# Altium footprint library Reflow3D1411sep.PcbLib: 657 footprints (part 35 of 42)
Each footprint in its own frame and in the unit in brackets; x right, y up, seen from the top. Pads: shape width x height; smd on the part's side, far side on the other; paste and mask are expansions set on the pad; w line width, h text height; cw(c..) or ccw(c..) is an arc to the next point about the centre after c.
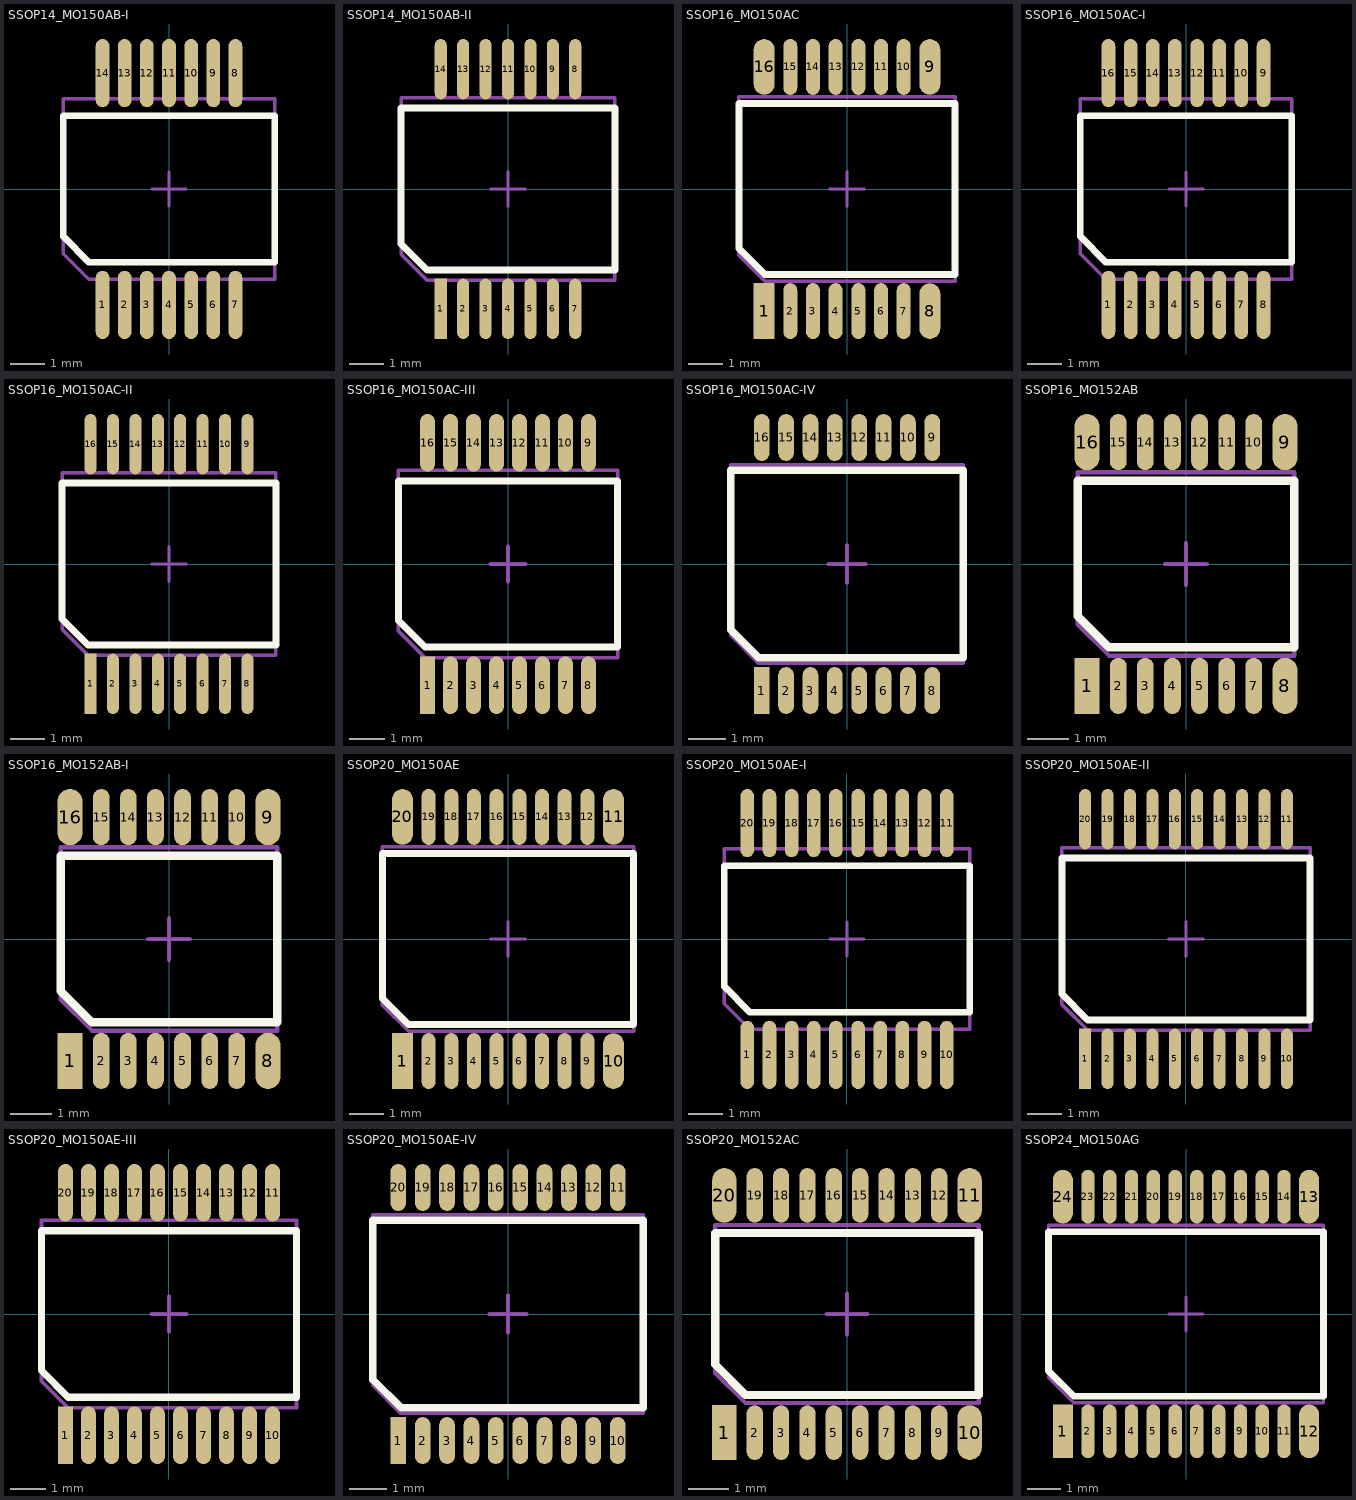
[diagram p34: the footprints below, top view; thin cyan lines are the x and y axes]

## SSOP14_MO150AB-I [mm] "www.ti.com, msso002e.pdf, DB14.asc; www.jedec.org, Mo-150b.pdf"
height 1.85
pads (14):
  oval 0.4x2 smd mask+0.05: 1(-1.95,-3.4) 2(-1.3,-3.4) 3(-0.65,-3.4) 4(0,-3.4) 5(0.65,-3.4) 6(1.3,-3.4) 7(1.95,-3.4) 8(1.95,3.4) 9(1.3,3.4) 10(0.65,3.4) 11(0,3.4) 12(-0.65,3.4) 13(-1.3,3.4) 14(-1.95,3.4)
Top Overlay:
  lines w0.2: -3.1,-1.4 -3.1,2.15 3.1,2.15 3.1,-2.15 -2.35,-2.15 -3.1,-1.4
Mechanical 13:
  lines w0.1: -3.1,-1.9 -3.1,2.65 3.1,2.65 3.1,-2.65 -2.35,-2.65 -3.1,-1.9
Mechanical 15:
  lines w0.1: -0.5,0 0.5,0 ; 0,-0.5 0,0.5
3D body: height 2, standoff 0, extent -3.25,-2.8 3.25,2.8

## SSOP14_MO150AB-II [mm] "www.idt.com, PSC4032.pdf"
height 1.86
pads (14):
  rect 0.35x1.75 smd mask+0.075: 1(-1.95,-3.475)
  oval 0.35x1.75 smd mask+0.075: 2(-1.3,-3.475) 3(-0.65,-3.475) 4(0,-3.475) 5(0.65,-3.475) 6(1.3,-3.475) 7(1.95,-3.475) 8(1.95,3.475) 9(1.3,3.475) 10(0.65,3.475) 11(0,3.475) 12(-0.65,3.475) 13(-1.3,3.475) 14(-1.95,3.475)
Top Overlay:
  lines w0.2: -3.1,-1.6 -3.1,2.35 3.1,2.35 3.1,-2.35 -2.35,-2.35 -3.1,-1.6
Mechanical 13:
  lines w0.1: -3.1,-1.9 -2.35,-2.65 3.1,-2.65 3.1,2.65 -3.1,2.65 -3.1,-1.9
Mechanical 15:
  lines w0.1: -0.5,0 0.5,0 ; 0,-0.5 0,0.5
3D body: height 1.99, standoff 0, extent -3.25,-2.69 3.25,2.69

## SSOP16_MO150AC [mm] "www.nxp.com, sot338-1.pdf, SOT338-1_fp_reflow.pdf"
height 1.85
pads (16):
  rect 0.6x1.6 smd mask+0.05: 1(-2.375,-3.5)
  oval 0.4x1.6 smd mask+0.05: 2(-1.625,-3.5) 3(-0.975,-3.5) 4(-0.325,-3.5) 5(0.325,-3.5) 6(0.975,-3.5) 7(1.625,-3.5) 10(1.625,3.5) 11(0.975,3.5) 12(0.325,3.5) 13(-0.325,3.5) 14(-0.975,3.5) 15(-1.625,3.5)
  oval 0.6x1.6 smd mask+0.05: 8(2.375,-3.5) 9(2.375,3.5) 16(-2.375,3.5)
Top Overlay:
  lines w0.2: -3.1,-1.7 -2.35,-2.45 3.1,-2.45 3.1,2.45 -3.1,2.45 -3.1,-1.7
Mechanical 13:
  lines w0.1: -3.1,-1.9 -2.35,-2.65 3.1,-2.65 3.1,2.65 -3.1,2.65 -3.1,-1.9
Mechanical 15:
  lines w0.1: -0.5,0 0.5,0 ; 0,-0.5 0,0.5
3D body: height 2, standoff 0, extent -3.2,-2.7 3.2,2.7

## SSOP16_MO150AC-I [mm] "www.ti.com, msso002e.pdf, DB16.asc; www.jedec.org, Mo-150b.pdf"
height 1.85
pads (16):
  oval 0.4x2 smd mask+0.05: 1(-2.275,-3.4) 2(-1.625,-3.4) 3(-0.975,-3.4) 4(-0.325,-3.4) 5(0.325,-3.4) 6(0.975,-3.4) 7(1.625,-3.4) 8(2.275,-3.4) 9(2.275,3.4) 10(1.625,3.4) 11(0.975,3.4) 12(0.325,3.4) 13(-0.325,3.4) 14(-0.975,3.4) 15(-1.625,3.4) 16(-2.275,3.4)
Top Overlay:
  lines w0.2: -3.1,-1.4 -2.35,-2.15 3.1,-2.15 3.1,2.15 -3.1,2.15 -3.1,-1.4
Mechanical 13:
  lines w0.1: -3.1,-1.9 -2.35,-2.65 3.1,-2.65 3.1,2.65 -3.1,2.65 -3.1,-1.9
Mechanical 15:
  lines w0.1: -0.5,0 0.5,0 ; 0,-0.5 0,0.5
3D body: height 2, standoff 0, extent -3.25,-2.8 3.25,2.8

## SSOP16_MO150AC-II [mm] "www.idt.com, PSC4032.pdf"
height 1.86
pads (16):
  rect 0.35x1.75 smd mask+0.075: 1(-2.275,-3.475)
  oval 0.35x1.75 smd mask+0.075: 2(-1.625,-3.475) 3(-0.975,-3.475) 4(-0.325,-3.475) 5(0.325,-3.475) 6(0.975,-3.475) 7(1.625,-3.475) 8(2.275,-3.475) 9(2.275,3.475) 10(1.625,3.475) 11(0.975,3.475) 12(0.325,3.475) 13(-0.325,3.475) 14(-0.975,3.475) 15(-1.625,3.475) 16(-2.275,3.475)
Top Overlay:
  lines w0.2: -3.1,-1.6 -3.1,2.35 3.1,2.35 3.1,-2.35 -2.35,-2.35 -3.1,-1.6
Mechanical 13:
  lines w0.1: -3.1,-1.9 -2.35,-2.65 3.1,-2.65 3.1,2.65 -3.1,2.65 -3.1,-1.9
Mechanical 15:
  lines w0.1: -0.5,0 0.5,0 ; 0,-0.5 0,0.5
3D body: height 1.99, standoff 0, extent -3.25,-2.69 3.25,2.69

## SSOP16_MO150AC-III [mm] "www.maxim-ic.com, 21-0056.PDF, 90-0106.PDF"
height 1.86
pads (16):
  rect 0.42x1.63 smd mask+0.05: 1(-2.275,-3.425)
  oval 0.42x1.63 smd mask+0.05: 2(-1.625,-3.425) 3(-0.975,-3.425) 4(-0.325,-3.425) 5(0.325,-3.425) 6(0.975,-3.425) 7(1.625,-3.425) 8(2.275,-3.425) 9(2.275,3.425) 10(1.625,3.425) 11(0.975,3.425) 12(0.325,3.425) 13(-0.325,3.425) 14(-0.975,3.425) 15(-1.625,3.425) 16(-2.275,3.425)
Top Overlay:
  lines w0.2: -3.1,-1.6 -2.35,-2.35 3.1,-2.35 3.1,2.35 -3.1,2.35 -3.1,-1.6
Mechanical 13:
  lines w0.1: -3.1,-1.895 -3.1,2.645 3.1,2.645 3.1,-2.645 -2.35,-2.645 -3.1,-1.895
Mechanical 15:
  lines w0.1: -0.5,0 0.5,0 ; 0,-0.5 0,0.5
3D body: height 1.99, standoff 0, extent -3.165,-2.69 3.165,2.69

## SSOP16_MO150AC-IV [mm] "www.linear.com, SSOP_16_05-08-1640.pdf; www.jedec.org, Mo-150b.pdf"
height 1.85
pads (16):
  rect 0.42x1.25 smd mask+0.05: 1(-2.275,-3.375)
  oval 0.42x1.25 smd mask+0.05: 2(-1.625,-3.375) 3(-0.975,-3.375) 4(-0.325,-3.375) 5(0.325,-3.375) 6(0.975,-3.375) 7(1.625,-3.375) 8(2.275,-3.375) 9(2.275,3.375) 10(1.625,3.375) 11(0.975,3.375) 12(0.325,3.375) 13(-0.325,3.375) 14(-0.975,3.375) 15(-1.625,3.375) 16(-2.275,3.375)
Top Overlay:
  lines w0.2: -3.1,-1.75 -2.35,-2.5 3.1,-2.5 3.1,2.5 -3.1,2.5 -3.1,-1.75
Mechanical 13:
  lines w0.1: -3.1,-1.9 -2.35,-2.65 3.1,-2.65 3.1,2.65 -3.1,2.65 -3.1,-1.9
Mechanical 15:
  lines w0.1: -0.5,0 0.5,0 ; 0,-0.5 0,0.5
3D body: height 2, standoff 0, extent -3.25,-2.8 3.25,2.8

## SSOP16_MO152AB [mm] "www.nxp.com, sot369-1_po.pdf, SOT369-1_fp_reflow.pdf"
height 1.35
pads (16):
  rect 0.6x1.35 smd mask+0.05: 1(-2.375,-2.925)
  oval 0.4x1.35 smd mask+0.05: 2(-1.625,-2.925) 3(-0.975,-2.925) 4(-0.325,-2.925) 5(0.325,-2.925) 6(0.975,-2.925) 7(1.625,-2.925) 10(1.625,2.925) 11(0.975,2.925) 12(0.325,2.925) 13(-0.325,2.925) 14(-0.975,2.925) 15(-1.625,2.925)
  oval 0.6x1.35 smd mask+0.05: 8(2.375,-2.925) 9(2.375,2.925) 16(-2.375,2.925)
Top Overlay:
  lines w0.2: -2.6,-1.25 -1.85,-2 2.6,-2 2.6,2 -2.6,2 -2.6,-1.25
Mechanical 13:
  lines w0.1: -2.6,-1.45 -1.85,-2.2 2.6,-2.2 2.6,2.2 -2.6,2.2 -2.6,-1.45
Mechanical 15:
  lines w0.1: -0.5,0 0.5,0 ; 0,-0.5 0,0.5
3D body: height 1.5, standoff 0, extent -2.65,-2.25 2.65,2.25

## SSOP16_MO152AB-I [mm] "www.renesas.com, p16ma-65-faa.pdf; www.nxp.com, SOT369-1_fp_reflow.pdf"
height 1.63
pads (16):
  rect 0.6x1.35 smd mask+0.05: 1(-2.375,-2.925)
  oval 0.4x1.35 smd mask+0.05: 2(-1.625,-2.925) 3(-0.975,-2.925) 4(-0.325,-2.925) 5(0.325,-2.925) 6(0.975,-2.925) 7(1.625,-2.925) 10(1.625,2.925) 11(0.975,2.925) 12(0.325,2.925) 13(-0.325,2.925) 14(-0.975,2.925) 15(-1.625,2.925)
  oval 0.6x1.35 smd mask+0.05: 8(2.375,-2.925) 9(2.375,2.925) 16(-2.375,2.925)
Top Overlay:
  lines w0.2: -2.6,-1.25 -2.6,2 2.6,2 2.6,-2 -1.85,-2 -2.6,-1.25
Mechanical 13:
  lines w0.1: -2.6,-1.45 -2.6,2.2 2.6,2.2 2.6,-2.2 -1.85,-2.2 -2.6,-1.45
Mechanical 15:
  lines w0.1: -0.5,0 0.5,0 ; 0,-0.5 0,0.5
3D body: height 1.73, standoff 0, extent -2.675,-2.3 2.675,2.3

## SSOP20_MO150AE [mm] "www.nxp.com, sot339-1_po.pdf, sot339-1_fr.pdf"
height 1.85
pads (20):
  rect 0.6x1.6 smd mask+0.05: 1(-3.025,-3.5)
  oval 0.4x1.6 smd mask+0.05: 2(-2.275,-3.5) 3(-1.625,-3.5) 4(-0.975,-3.5) 5(-0.325,-3.5) 6(0.325,-3.5) 7(0.975,-3.5) 8(1.625,-3.5) 9(2.275,-3.5) 12(2.275,3.5) 13(1.625,3.5) 14(0.975,3.5) 15(0.325,3.5) 16(-0.325,3.5) 17(-0.975,3.5) 18(-1.625,3.5) 19(-2.275,3.5)
  oval 0.6x1.6 smd mask+0.05: 10(3.025,-3.5) 11(3.025,3.5) 20(-3.025,3.5)
Top Overlay:
  lines w0.2: -3.6,-1.7 -2.85,-2.45 3.6,-2.45 3.6,2.45 -3.6,2.45 -3.6,-1.7
Mechanical 13:
  lines w0.1: -3.6,-1.9 -2.85,-2.65 3.6,-2.65 3.6,2.65 -3.6,2.65 -3.6,-1.9
Mechanical 15:
  lines w0.1: -0.5,0 0.5,0 ; 0,-0.5 0,0.5
3D body: height 2, standoff 0, extent -3.7,-2.7 3.7,2.7

## SSOP20_MO150AE-I [mm] "www.ti.com, msso002e.pdf, DB20.asc; www.jedec.org, Mo-150b.pdf"
height 1.85
pads (20):
  oval 0.4x2 smd mask+0.05: 1(-2.925,-3.4) 2(-2.275,-3.4) 3(-1.625,-3.4) 4(-0.975,-3.4) 5(-0.325,-3.4) 6(0.325,-3.4) 7(0.975,-3.4) 8(1.625,-3.4) 9(2.275,-3.4) 10(2.925,-3.4) 11(2.925,3.4) 12(2.275,3.4) 13(1.625,3.4) 14(0.975,3.4) 15(0.325,3.4) 16(-0.325,3.4) 17(-0.975,3.4) 18(-1.625,3.4) 19(-2.275,3.4) 20(-2.925,3.4)
Top Overlay:
  lines w0.2: -3.6,-1.4 -3.6,2.15 3.6,2.15 3.6,-2.15 -2.85,-2.15 -3.6,-1.4
Mechanical 13:
  lines w0.1: -3.6,-1.9 -3.6,2.65 3.6,2.65 3.6,-2.65 -2.85,-2.65 -3.6,-1.9
Mechanical 15:
  lines w0.1: -0.5,0 0.5,0 ; 0,-0.5 0,0.5
3D body: height 2, standoff 0, extent -3.75,-2.8 3.75,2.8

## SSOP20_MO150AE-II [mm] "www.idt.com, PSC4032.pdf"
height 1.86
pads (20):
  rect 0.35x1.75 smd mask+0.075: 1(-2.925,-3.475)
  oval 0.35x1.75 smd mask+0.075: 2(-2.275,-3.475) 3(-1.625,-3.475) 4(-0.975,-3.475) 5(-0.325,-3.475) 6(0.325,-3.475) 7(0.975,-3.475) 8(1.625,-3.475) 9(2.275,-3.475) 10(2.925,-3.475) 11(2.925,3.475) 12(2.275,3.475) 13(1.625,3.475) 14(0.975,3.475) 15(0.325,3.475) 16(-0.325,3.475) 17(-0.975,3.475) 18(-1.625,3.475) 19(-2.275,3.475) 20(-2.925,3.475)
Top Overlay:
  lines w0.2: -3.6,-1.6 -2.85,-2.35 3.6,-2.35 3.6,2.35 -3.6,2.35 -3.6,-1.6
Mechanical 13:
  lines w0.1: -3.6,-1.9 -3.6,2.65 3.6,2.65 3.6,-2.65 -2.85,-2.65 -3.6,-1.9
Mechanical 15:
  lines w0.1: -0.5,0 0.5,0 ; 0,-0.5 0,0.5
3D body: height 1.99, standoff 0, extent -3.665,-2.69 3.665,2.69

## SSOP20_MO150AE-III [mm] "www.maxim-ic.com, 21-0056.PDF, 90-0094.PDF"
height 1.86
pads (20):
  rect 0.42x1.62 smd mask+0.05: 1(-2.925,-3.425)
  oval 0.42x1.62 smd mask+0.05: 2(-2.275,-3.425) 3(-1.625,-3.425) 4(-0.975,-3.425) 5(-0.325,-3.425) 6(0.325,-3.425) 7(0.975,-3.425) 8(1.625,-3.425) 9(2.275,-3.425) 10(2.925,-3.425) 11(2.925,3.425) 12(2.275,3.425) 13(1.625,3.425) 14(0.975,3.425) 15(0.325,3.425) 16(-0.325,3.425) 17(-0.975,3.425) 18(-1.625,3.425) 19(-2.275,3.425) 20(-2.925,3.425)
Top Overlay:
  lines w0.2: -3.6,-1.6 -3.6,2.35 3.6,2.35 3.6,-2.35 -2.85,-2.35 -3.6,-1.6
Mechanical 13:
  lines w0.1: -3.6,-1.895 -2.85,-2.645 3.6,-2.645 3.6,2.645 -3.6,2.645 -3.6,-1.895
Mechanical 15:
  lines w0.1: -0.5,0 0.5,0 ; 0,-0.5 0,0.5
3D body: height 1.99, standoff 0, extent -3.665,-2.69 3.665,2.69

## SSOP20_MO150AE-IV [mm] "www.linear.com, SSOP_20_05-08-1640.pdf; www.jedec.org, Mo-150b.pdf"
height 1.85
pads (20):
  rect 0.42x1.25 smd mask+0.05: 1(-2.925,-3.375)
  oval 0.42x1.25 smd mask+0.05: 2(-2.275,-3.375) 3(-1.625,-3.375) 4(-0.975,-3.375) 5(-0.325,-3.375) 6(0.325,-3.375) 7(0.975,-3.375) 8(1.625,-3.375) 9(2.275,-3.375) 10(2.925,-3.375) 11(2.925,3.375) 12(2.275,3.375) 13(1.625,3.375) 14(0.975,3.375) 15(0.325,3.375) 16(-0.325,3.375) 17(-0.975,3.375) 18(-1.625,3.375) 19(-2.275,3.375) 20(-2.925,3.375)
Top Overlay:
  lines w0.2: -3.6,-1.75 -2.85,-2.5 3.6,-2.5 3.6,2.5 -3.6,2.5 -3.6,-1.75
Mechanical 13:
  lines w0.1: -3.6,-1.9 -2.85,-2.65 3.6,-2.65 3.6,2.65 -3.6,2.65 -3.6,-1.9
Mechanical 15:
  lines w0.1: -0.5,0 0.5,0 ; 0,-0.5 0,0.5
3D body: height 2, standoff 0, extent -3.75,-2.8 3.75,2.8

## SSOP20_MO152AC [mm] "www.nxp.com, sot266-1_po.pdf, sot266-1_fr.pdf"
height 1.35
pads (20):
  rect 0.6x1.35 smd mask+0.05: 1(-3.025,-2.925)
  oval 0.4x1.35 smd mask+0.05: 2(-2.275,-2.925) 3(-1.625,-2.925) 4(-0.975,-2.925) 5(-0.325,-2.925) 6(0.325,-2.925) 7(0.975,-2.925) 8(1.625,-2.925) 9(2.275,-2.925) 12(2.275,2.925) 13(1.625,2.925) 14(0.975,2.925) 15(0.325,2.925) 16(-0.325,2.925) 17(-0.975,2.925) 18(-1.625,2.925) 19(-2.275,2.925)
  oval 0.6x1.35 smd mask+0.05: 10(3.025,-2.925) 11(3.025,2.925) 20(-3.025,2.925)
Top Overlay:
  lines w0.2: -3.25,-1.25 -3.25,2 3.25,2 3.25,-2 -2.5,-2 -3.25,-1.25
Mechanical 13:
  lines w0.1: -3.25,-1.45 -3.25,2.2 3.25,2.2 3.25,-2.2 -2.5,-2.2 -3.25,-1.45
Mechanical 15:
  lines w0.1: -0.5,0 0.5,0 ; 0,-0.5 0,0.5
3D body: height 1.5, standoff 0, extent -3.3,-2.25 3.3,2.25

## SSOP24_MO150AG [mm] "www.nxp.com, sot340-1_po.pdf, SOT340-1_fp_reflow.pdf"
height 1.85
pads (24):
  rect 0.6x1.6 smd mask+0.05: 1(-3.675,-3.5)
  oval 0.4x1.6 smd mask+0.05: 2(-2.925,-3.5) 3(-2.275,-3.5) 4(-1.625,-3.5) 5(-0.975,-3.5) 6(-0.325,-3.5) 7(0.325,-3.5) 8(0.975,-3.5) 9(1.625,-3.5) 10(2.275,-3.5) 11(2.925,-3.5) 14(2.925,3.5) 15(2.275,3.5) 16(1.625,3.5) 17(0.975,3.5) 18(0.325,3.5) 19(-0.325,3.5) 20(-0.975,3.5) 21(-1.625,3.5) 22(-2.275,3.5) 23(-2.925,3.5)
  oval 0.6x1.6 smd mask+0.05: 12(3.675,-3.5) 13(3.675,3.5) 24(-3.675,3.5)
Top Overlay:
  lines w0.2: -4.1,-1.7 -3.35,-2.45 4.1,-2.45 4.1,2.45 -4.1,2.45 -4.1,-1.7
Mechanical 13:
  lines w0.1: -4.1,-1.9 -3.35,-2.65 4.1,-2.65 4.1,2.65 -4.1,2.65 -4.1,-1.9
Mechanical 15:
  lines w0.1: -0.5,0 0.5,0 ; 0,-0.5 0,0.5
3D body: height 2, standoff 0, extent -4.2,-2.7 4.2,2.7